# Altium schematic symbol library jlcpcb_2025_04_capacitors_extended_0402.schlib: 3594 symbols (part 14 of 20) (continued)
## GJM1555C1H1R0WB01D
designator C?  Capacitance: 1pF  (hidden comment: *)
Capacitor, Ceramic (MLCC), 1pF, 50V, C0G, SMD 0402; Manufacturer: Murata Electronics; Manufacturer Part Number: GJM1555C1H1R0WB01D; Package Size: 0402; JLCPCB Basic Part: No; JLCPCB Part Number: C72134; Supplier 1: LCSC; Category: Capacitors - MLCC; Supplier Part Number 1: C72134; Voltage Rating: 50V; Temperature Coefficient: C0G; RoHS: Yes; ComponentLink1Description: Datasheet; ComponentLink1URL: https://wmsc.lcsc.com/wmsc/upload/file/pdf/v2/lcsc/1811081612_Murata-Electronics-GJM1555C1H1R0WB01D_C72134.pdf; ComponentLink2Description: JLCPCB Part URL; ComponentLink2URL: https://jlcpcb.com/partdetail/C72134; ComponentLink3Description: LCSC Part URL; ComponentLink3URL: https://lcsc.com/product-detail/Multilayer-Ceramic-Capacitors-MLCC---SMD-SMT_Murata-Electronics-Murata-Electronics-GJM1555C1H1R0WB01D_C72134.html
footprint CAP-0402 (0402 (1005M) Capacitor)
pins: 1, 2

## GJM1555C1H1R1BB01D
designator C?  Capacitance: 1.1pF  (hidden comment: *)
Capacitor, Ceramic (MLCC), 1.1pF, 50V, C0G, SMD 0402; Manufacturer: Murata Electronics; Manufacturer Part Number: GJM1555C1H1R1BB01D; Package Size: 0402; JLCPCB Basic Part: No; JLCPCB Part Number: C161308; Supplier 1: LCSC; Category: Capacitors - MLCC; Supplier Part Number 1: C161308; Voltage Rating: 50V; Temperature Coefficient: C0G; RoHS: Yes; ComponentLink1Description: Datasheet; ComponentLink1URL: https://wmsc.lcsc.com/wmsc/upload/file/pdf/v2/lcsc/2304140030_Murata-Electronics-GJM1555C1H1R1BB01D_C161308.pdf; ComponentLink2Description: JLCPCB Part URL; ComponentLink2URL: https://jlcpcb.com/partdetail/C161308; ComponentLink3Description: LCSC Part URL; ComponentLink3URL: https://lcsc.com/product-detail/Multilayer-Ceramic-Capacitors-MLCC---SMD-SMT_Murata-Electronics-Murata-Electronics-GJM1555C1H1R1BB01D_C161308.html
footprint CAP-0402 (0402 (1005M) Capacitor)
pins: 1, 2

## GJM1555C1H1R1CB01D
designator C?  Capacitance: 1.1pF  (hidden comment: *)
Capacitor, Ceramic (MLCC), 1.1pF, 50V, C0G, SMD 0402; Manufacturer: Murata Electronics; Manufacturer Part Number: GJM1555C1H1R1CB01D; Package Size: 0402; JLCPCB Basic Part: No; JLCPCB Part Number: C237498; Supplier 1: LCSC; Category: Capacitors - MLCC; Supplier Part Number 1: C237498; Voltage Rating: 50V; Temperature Coefficient: C0G; RoHS: Yes; ComponentLink1Description: Datasheet; ComponentLink1URL: https://wmsc.lcsc.com/wmsc/upload/file/pdf/v2/lcsc/2304140030_Murata-Electronics-GJM1555C1H1R1CB01D_C237498.pdf; ComponentLink2Description: JLCPCB Part URL; ComponentLink2URL: https://jlcpcb.com/partdetail/C237498; ComponentLink3Description: LCSC Part URL; ComponentLink3URL: https://lcsc.com/product-detail/Multilayer-Ceramic-Capacitors-MLCC---SMD-SMT_Murata-Electronics-Murata-Electronics-GJM1555C1H1R1CB01D_C237498.html
footprint CAP-0402 (0402 (1005M) Capacitor)
pins: 1, 2

## GJM1555C1H1R1WB01D
designator C?  Capacitance: 1.1pF  (hidden comment: *)
Capacitor, Ceramic (MLCC), 1.1pF, 50V, C0G, SMD 0402; Manufacturer: Murata Electronics; Manufacturer Part Number: GJM1555C1H1R1WB01D; Package Size: 0402; JLCPCB Basic Part: No; JLCPCB Part Number: C88879; Supplier 1: LCSC; Category: Capacitors - MLCC; Supplier Part Number 1: C88879; Voltage Rating: 50V; Temperature Coefficient: C0G; RoHS: Yes; ComponentLink1Description: Datasheet; ComponentLink1URL: https://wmsc.lcsc.com/wmsc/upload/file/pdf/v2/lcsc/2304140030_Murata-Electronics-GJM1555C1H1R1WB01D_C88879.pdf; ComponentLink2Description: JLCPCB Part URL; ComponentLink2URL: https://jlcpcb.com/partdetail/C88879; ComponentLink3Description: LCSC Part URL; ComponentLink3URL: https://lcsc.com/product-detail/Multilayer-Ceramic-Capacitors-MLCC---SMD-SMT_Murata-Electronics-Murata-Electronics-GJM1555C1H1R1WB01D_C88879.html
footprint CAP-0402 (0402 (1005M) Capacitor)
pins: 1, 2

## GJM1555C1H1R2BB01D
designator C?  Capacitance: 1.2pF  (hidden comment: *)
Capacitor, Ceramic (MLCC), 1.2pF, 50V, SMD 0402; Manufacturer: Murata Electronics; Manufacturer Part Number: GJM1555C1H1R2BB01D; Package Size: 0402; JLCPCB Basic Part: No; JLCPCB Part Number: C72135; Supplier 1: LCSC; Category: Capacitors - MLCC; Supplier Part Number 1: C72135; Voltage Rating: 50V; RoHS: Yes; ComponentLink1Description: Datasheet; ComponentLink1URL: https://wmsc.lcsc.com/wmsc/upload/file/pdf/v2/lcsc/1811081614_Murata-Electronics-GJM1555C1H1R2BB01D_C72135.pdf; ComponentLink2Description: JLCPCB Part URL; ComponentLink2URL: https://jlcpcb.com/partdetail/C72135; ComponentLink3Description: LCSC Part URL; ComponentLink3URL: https://lcsc.com/product-detail/Multilayer-Ceramic-Capacitors-MLCC---SMD-SMT_Murata-Electronics-Murata-Electronics-GJM1555C1H1R2BB01D_C72135.html
footprint CAP-0402 (0402 (1005M) Capacitor)
pins: 1, 2

## GJM1555C1H1R2CB01D
designator C?  Capacitance: 1.2pF  (hidden comment: *)
Capacitor, Ceramic (MLCC), 1.2pF, 50V, C0G, SMD 0402; Manufacturer: Murata Electronics; Manufacturer Part Number: GJM1555C1H1R2CB01D; Package Size: 0402; JLCPCB Basic Part: No; JLCPCB Part Number: C85877; Supplier 1: LCSC; Category: Capacitors - MLCC; Supplier Part Number 1: C85877; Voltage Rating: 50V; Temperature Coefficient: C0G; RoHS: Yes; ComponentLink1Description: Datasheet; ComponentLink1URL: https://wmsc.lcsc.com/wmsc/upload/file/pdf/v2/lcsc/2304140030_Murata-Electronics-GJM1555C1H1R2CB01D_C85877.pdf; ComponentLink2Description: JLCPCB Part URL; ComponentLink2URL: https://jlcpcb.com/partdetail/C85877; ComponentLink3Description: LCSC Part URL; ComponentLink3URL: https://lcsc.com/product-detail/Multilayer-Ceramic-Capacitors-MLCC---SMD-SMT_Murata-Electronics-Murata-Electronics-GJM1555C1H1R2CB01D_C85877.html
footprint CAP-0402 (0402 (1005M) Capacitor)
pins: 1, 2

## GJM1555C1H1R2JB01D
designator C?  Capacitance: 1.2pF  (hidden comment: *)
Capacitor, Ceramic (MLCC), 1.2pF, ±5%, null, null, ±5%, SMD 0402; Manufacturer: Murata Electronics; Manufacturer Part Number: GJM1555C1H1R2JB01D; Package Size: 0402; JLCPCB Basic Part: No; JLCPCB Part Number: C907946; Supplier 1: LCSC; Category: Capacitors - MLCC; Supplier Part Number 1: C907946; Tolerance: ±5%; Voltage Rating: null; Temperature Coefficient: null; RoHS: Yes; ComponentLink1Description: Datasheet; ComponentLink1URL: https://wmsc.lcsc.com/wmsc/upload/file/pdf/v2/lcsc/2201242100_Murata-Electronics-GJM1555C1H1R2JB01D_C907946.pdf; ComponentLink2Description: JLCPCB Part URL; ComponentLink2URL: https://jlcpcb.com/partdetail/C907946; ComponentLink3Description: LCSC Part URL; ComponentLink3URL: https://lcsc.com/product-detail/Multilayer-Ceramic-Capacitors-MLCC---SMD-SMT_Murata-Electronics-Murata-Electronics-GJM1555C1H1R2JB01D_C907946.html
footprint CAP-0402 (0402 (1005M) Capacitor)
pins: 1, 2

## GJM1555C1H1R2WB01D
designator C?  Capacitance: 1.2pF  (hidden comment: *)
Capacitor, Ceramic (MLCC), 1.2pF, 50V, C0G, SMD 0402; Manufacturer: Murata Electronics; Manufacturer Part Number: GJM1555C1H1R2WB01D; Package Size: 0402; JLCPCB Basic Part: No; JLCPCB Part Number: C76899; Supplier 1: LCSC; Category: Capacitors - MLCC; Supplier Part Number 1: C76899; Voltage Rating: 50V; Temperature Coefficient: C0G; RoHS: Yes; ComponentLink1Description: Datasheet; ComponentLink1URL: https://wmsc.lcsc.com/wmsc/upload/file/pdf/v2/lcsc/1811081710_Murata-Electronics-GJM1555C1H1R2WB01D_C76899.pdf; ComponentLink2Description: JLCPCB Part URL; ComponentLink2URL: https://jlcpcb.com/partdetail/C76899; ComponentLink3Description: LCSC Part URL; ComponentLink3URL: https://lcsc.com/product-detail/Multilayer-Ceramic-Capacitors-MLCC---SMD-SMT_Murata-Electronics-Murata-Electronics-GJM1555C1H1R2WB01D_C76899.html
footprint CAP-0402 (0402 (1005M) Capacitor)
pins: 1, 2

## GJM1555C1H1R3BB01D
designator C?  Capacitance: 1.3pF  (hidden comment: *)
Capacitor, Ceramic (MLCC), 1.3pF, 50V, C0G, SMD 0402; Manufacturer: Murata Electronics; Manufacturer Part Number: GJM1555C1H1R3BB01D; Package Size: 0402; JLCPCB Basic Part: No; JLCPCB Part Number: C161309; Supplier 1: LCSC; Category: Capacitors - MLCC; Supplier Part Number 1: C161309; Voltage Rating: 50V; Temperature Coefficient: C0G; RoHS: Yes; ComponentLink1Description: Datasheet; ComponentLink1URL: https://wmsc.lcsc.com/wmsc/upload/file/pdf/v2/lcsc/1811081521_Murata-Electronics-GJM1555C1H1R3BB01D_C161309.pdf; ComponentLink2Description: JLCPCB Part URL; ComponentLink2URL: https://jlcpcb.com/partdetail/C161309; ComponentLink3Description: LCSC Part URL; ComponentLink3URL: https://lcsc.com/product-detail/Multilayer-Ceramic-Capacitors-MLCC---SMD-SMT_Murata-Electronics-Murata-Electronics-GJM1555C1H1R3BB01D_C161309.html
footprint CAP-0402 (0402 (1005M) Capacitor)
pins: 1, 2

## GJM1555C1H1R3WB01D
designator C?  Capacitance: 1.3pF  (hidden comment: *)
Capacitor, Ceramic (MLCC), 1.3pF, 50V, C0G, SMD 0402; Manufacturer: Murata Electronics; Manufacturer Part Number: GJM1555C1H1R3WB01D; Package Size: 0402; JLCPCB Basic Part: No; JLCPCB Part Number: C88880; Supplier 1: LCSC; Category: Capacitors - MLCC; Supplier Part Number 1: C88880; Voltage Rating: 50V; Temperature Coefficient: C0G; RoHS: Yes; ComponentLink1Description: Datasheet; ComponentLink1URL: https://wmsc.lcsc.com/wmsc/upload/file/pdf/v2/lcsc/2304140030_Murata-Electronics-GJM1555C1H1R3WB01D_C88880.pdf; ComponentLink2Description: JLCPCB Part URL; ComponentLink2URL: https://jlcpcb.com/partdetail/C88880; ComponentLink3Description: LCSC Part URL; ComponentLink3URL: https://lcsc.com/product-detail/Multilayer-Ceramic-Capacitors-MLCC---SMD-SMT_Murata-Electronics-Murata-Electronics-GJM1555C1H1R3WB01D_C88880.html
footprint CAP-0402 (0402 (1005M) Capacitor)
pins: 1, 2

## GJM1555C1H1R4BB01D
designator C?  Capacitance: 1.4pF  (hidden comment: *)
Capacitor, Ceramic (MLCC), 1.4pF, 50V, C0G, SMD 0402; Manufacturer: Murata Electronics; Manufacturer Part Number: GJM1555C1H1R4BB01D; Package Size: 0402; JLCPCB Basic Part: No; JLCPCB Part Number: C161310; Supplier 1: LCSC; Category: Capacitors - MLCC; Supplier Part Number 1: C161310; Voltage Rating: 50V; Temperature Coefficient: C0G; RoHS: Yes; ComponentLink1Description: Datasheet; ComponentLink1URL: https://wmsc.lcsc.com/wmsc/upload/file/pdf/v2/lcsc/2304140030_Murata-Electronics-GJM1555C1H1R4BB01D_C161310.pdf; ComponentLink2Description: JLCPCB Part URL; ComponentLink2URL: https://jlcpcb.com/partdetail/C161310; ComponentLink3Description: LCSC Part URL; ComponentLink3URL: https://lcsc.com/product-detail/Multilayer-Ceramic-Capacitors-MLCC---SMD-SMT_Murata-Electronics-Murata-Electronics-GJM1555C1H1R4BB01D_C161310.html
footprint CAP-0402 (0402 (1005M) Capacitor)
pins: 1, 2

## GJM1555C1H1R5BB01D
designator C?  Capacitance: 1.5pF  (hidden comment: *)
Capacitor, Ceramic (MLCC), 1.5pF, 50V, C0G, SMD 0402; Manufacturer: Murata Electronics; Manufacturer Part Number: GJM1555C1H1R5BB01D; Package Size: 0402; JLCPCB Basic Part: No; JLCPCB Part Number: C76900; Supplier 1: LCSC; Category: Capacitors - MLCC; Supplier Part Number 1: C76900; Voltage Rating: 50V; Temperature Coefficient: C0G; RoHS: Yes; ComponentLink1Description: Datasheet; ComponentLink1URL: https://wmsc.lcsc.com/wmsc/upload/file/pdf/v2/lcsc/1811081610_Murata-Electronics-GJM1555C1H1R5BB01D_C76900.pdf; ComponentLink2Description: JLCPCB Part URL; ComponentLink2URL: https://jlcpcb.com/partdetail/C76900; ComponentLink3Description: LCSC Part URL; ComponentLink3URL: https://lcsc.com/product-detail/Multilayer-Ceramic-Capacitors-MLCC---SMD-SMT_Murata-Electronics-Murata-Electronics-GJM1555C1H1R5BB01D_C76900.html
footprint CAP-0402 (0402 (1005M) Capacitor)
pins: 1, 2

## GJM1555C1H1R5CB01D
designator C?  Capacitance: 1.5pF  (hidden comment: *)
Capacitor, Ceramic (MLCC), 1.5pF, 50V, C0G, SMD 0402; Manufacturer: Murata Electronics; Manufacturer Part Number: GJM1555C1H1R5CB01D; Package Size: 0402; JLCPCB Basic Part: No; JLCPCB Part Number: C408127; Supplier 1: LCSC; Category: Capacitors - MLCC; Supplier Part Number 1: C408127; Voltage Rating: 50V; Temperature Coefficient: C0G; RoHS: Yes; ComponentLink1Description: Datasheet; ComponentLink1URL: https://wmsc.lcsc.com/wmsc/upload/file/pdf/v2/lcsc/2304140030_Murata-Electronics-GJM1555C1H1R5CB01D_C408127.pdf; ComponentLink2Description: JLCPCB Part URL; ComponentLink2URL: https://jlcpcb.com/partdetail/C408127; ComponentLink3Description: LCSC Part URL; ComponentLink3URL: https://lcsc.com/product-detail/Multilayer-Ceramic-Capacitors-MLCC---SMD-SMT_Murata-Electronics-Murata-Electronics-GJM1555C1H1R5CB01D_C408127.html
footprint CAP-0402 (0402 (1005M) Capacitor)
pins: 1, 2

## GJM1555C1H1R5WB01D
designator C?  Capacitance: 1.5pF  (hidden comment: *)
Capacitor, Ceramic (MLCC), 1.5pF, 50V, SMD 0402; Manufacturer: Murata Electronics; Manufacturer Part Number: GJM1555C1H1R5WB01D; Package Size: 0402; JLCPCB Basic Part: No; JLCPCB Part Number: C76901; Supplier 1: LCSC; Category: Capacitors - MLCC; Supplier Part Number 1: C76901; Voltage Rating: 50V; RoHS: Yes; ComponentLink1Description: Datasheet; ComponentLink1URL: https://wmsc.lcsc.com/wmsc/upload/file/pdf/v2/lcsc/1811131825_Murata-Electronics-GJM1555C1H1R5WB01D_C76901.pdf; ComponentLink2Description: JLCPCB Part URL; ComponentLink2URL: https://jlcpcb.com/partdetail/C76901; ComponentLink3Description: LCSC Part URL; ComponentLink3URL: https://lcsc.com/product-detail/Multilayer-Ceramic-Capacitors-MLCC---SMD-SMT_Murata-Electronics-Murata-Electronics-GJM1555C1H1R5WB01D_C76901.html
footprint CAP-0402 (0402 (1005M) Capacitor)
pins: 1, 2

## GJM1555C1H1R6BB01D
designator C?  Capacitance: 1.6pF  (hidden comment: *)
Capacitor, Ceramic (MLCC), 1.6pF, 50V, C0G, SMD 0402; Manufacturer: Murata Electronics; Manufacturer Part Number: GJM1555C1H1R6BB01D; Package Size: 0402; JLCPCB Basic Part: No; JLCPCB Part Number: C161311; Supplier 1: LCSC; Category: Capacitors - MLCC; Supplier Part Number 1: C161311; Voltage Rating: 50V; Temperature Coefficient: C0G; RoHS: Yes; ComponentLink1Description: Datasheet; ComponentLink1URL: https://wmsc.lcsc.com/wmsc/upload/file/pdf/v2/lcsc/1811081521_Murata-Electronics-GJM1555C1H1R6BB01D_C161311.pdf; ComponentLink2Description: JLCPCB Part URL; ComponentLink2URL: https://jlcpcb.com/partdetail/C161311; ComponentLink3Description: LCSC Part URL; ComponentLink3URL: https://lcsc.com/product-detail/Multilayer-Ceramic-Capacitors-MLCC---SMD-SMT_Murata-Electronics-Murata-Electronics-GJM1555C1H1R6BB01D_C161311.html
footprint CAP-0402 (0402 (1005M) Capacitor)
pins: 1, 2

## GJM1555C1H1R6CB01D
designator C?  Capacitance: 1.6pF  (hidden comment: *)
Capacitor, Ceramic (MLCC), 1.6pF, 50V, C0G, SMD 0402; Manufacturer: Murata Electronics; Manufacturer Part Number: GJM1555C1H1R6CB01D; Package Size: 0402; JLCPCB Basic Part: No; JLCPCB Part Number: C161312; Supplier 1: LCSC; Category: Capacitors - MLCC; Supplier Part Number 1: C161312; Voltage Rating: 50V; Temperature Coefficient: C0G; RoHS: Yes; ComponentLink1Description: Datasheet; ComponentLink1URL: https://wmsc.lcsc.com/wmsc/upload/file/pdf/v2/lcsc/2304140030_Murata-Electronics-GJM1555C1H1R6CB01D_C161312.pdf; ComponentLink2Description: JLCPCB Part URL; ComponentLink2URL: https://jlcpcb.com/partdetail/C161312; ComponentLink3Description: LCSC Part URL; ComponentLink3URL: https://lcsc.com/product-detail/Multilayer-Ceramic-Capacitors-MLCC---SMD-SMT_Murata-Electronics-Murata-Electronics-GJM1555C1H1R6CB01D_C161312.html
footprint CAP-0402 (0402 (1005M) Capacitor)
pins: 1, 2

## GJM1555C1H1R6WB01D
designator C?  Capacitance: 1.6pF  (hidden comment: *)
Capacitor, Ceramic (MLCC), 1.6pF, 50V, C0G, SMD 0402; Manufacturer: Murata Electronics; Manufacturer Part Number: GJM1555C1H1R6WB01D; Package Size: 0402; JLCPCB Basic Part: No; JLCPCB Part Number: C88881; Supplier 1: LCSC; Category: Capacitors - MLCC; Supplier Part Number 1: C88881; Voltage Rating: 50V; Temperature Coefficient: C0G; RoHS: Yes; ComponentLink1Description: Datasheet; ComponentLink1URL: https://wmsc.lcsc.com/wmsc/upload/file/pdf/v2/lcsc/2304140030_Murata-Electronics-GJM1555C1H1R6WB01D_C88881.pdf; ComponentLink2Description: JLCPCB Part URL; ComponentLink2URL: https://jlcpcb.com/partdetail/C88881; ComponentLink3Description: LCSC Part URL; ComponentLink3URL: https://lcsc.com/product-detail/Multilayer-Ceramic-Capacitors-MLCC---SMD-SMT_Murata-Electronics-Murata-Electronics-GJM1555C1H1R6WB01D_C88881.html
footprint CAP-0402 (0402 (1005M) Capacitor)
pins: 1, 2

## GJM1555C1H1R7BB01D
designator C?  Capacitance: 1.7pF  (hidden comment: *)
Capacitor, Ceramic (MLCC), 1.7pF, 50V, C0G, SMD 0402; Manufacturer: Murata Electronics; Manufacturer Part Number: GJM1555C1H1R7BB01D; Package Size: 0402; JLCPCB Basic Part: No; JLCPCB Part Number: C161313; Supplier 1: LCSC; Category: Capacitors - MLCC; Supplier Part Number 1: C161313; Voltage Rating: 50V; Temperature Coefficient: C0G; RoHS: Yes; ComponentLink1Description: Datasheet; ComponentLink1URL: https://wmsc.lcsc.com/wmsc/upload/file/pdf/v2/lcsc/2210251230_Murata-Electronics-GJM1555C1H1R7BB01D_C161313.pdf; ComponentLink2Description: JLCPCB Part URL; ComponentLink2URL: https://jlcpcb.com/partdetail/C161313; ComponentLink3Description: LCSC Part URL; ComponentLink3URL: https://lcsc.com/product-detail/Multilayer-Ceramic-Capacitors-MLCC---SMD-SMT_Murata-Electronics-Murata-Electronics-GJM1555C1H1R7BB01D_C161313.html
footprint CAP-0402 (0402 (1005M) Capacitor)
pins: 1, 2

## GJM1555C1H1R8BB01D
designator C?  Capacitance: 1.8pF  (hidden comment: *)
Capacitor, Ceramic (MLCC), 1.8pF, 50V, C0G, SMD 0402; Manufacturer: Murata Electronics; Manufacturer Part Number: GJM1555C1H1R8BB01D; Package Size: 0402; JLCPCB Basic Part: No; JLCPCB Part Number: C76902; Supplier 1: LCSC; Category: Capacitors - MLCC; Supplier Part Number 1: C76902; Voltage Rating: 50V; Temperature Coefficient: C0G; RoHS: Yes; ComponentLink1Description: Datasheet; ComponentLink1URL: https://wmsc.lcsc.com/wmsc/upload/file/pdf/v2/lcsc/1811081611_Murata-Electronics-GJM1555C1H1R8BB01D_C76902.pdf; ComponentLink2Description: JLCPCB Part URL; ComponentLink2URL: https://jlcpcb.com/partdetail/C76902; ComponentLink3Description: LCSC Part URL; ComponentLink3URL: https://lcsc.com/product-detail/Multilayer-Ceramic-Capacitors-MLCC---SMD-SMT_Murata-Electronics-Murata-Electronics-GJM1555C1H1R8BB01D_C76902.html
footprint CAP-0402 (0402 (1005M) Capacitor)
pins: 1, 2

## GJM1555C1H1R8CB01D
designator C?  Capacitance: 1.8pF  (hidden comment: *)
Capacitor, Ceramic (MLCC), 1.8pF, 50V, C0G, SMD 0402; Manufacturer: Murata Electronics; Manufacturer Part Number: GJM1555C1H1R8CB01D; Package Size: 0402; JLCPCB Basic Part: No; JLCPCB Part Number: C85878; Supplier 1: LCSC; Category: Capacitors - MLCC; Supplier Part Number 1: C85878; Voltage Rating: 50V; Temperature Coefficient: C0G; RoHS: Yes; ComponentLink1Description: Datasheet; ComponentLink1URL: https://wmsc.lcsc.com/wmsc/upload/file/pdf/v2/lcsc/2304140030_Murata-Electronics-GJM1555C1H1R8CB01D_C85878.pdf; ComponentLink2Description: JLCPCB Part URL; ComponentLink2URL: https://jlcpcb.com/partdetail/C85878; ComponentLink3Description: LCSC Part URL; ComponentLink3URL: https://lcsc.com/product-detail/Multilayer-Ceramic-Capacitors-MLCC---SMD-SMT_Murata-Electronics-Murata-Electronics-GJM1555C1H1R8CB01D_C85878.html
footprint CAP-0402 (0402 (1005M) Capacitor)
pins: 1, 2

## GJM1555C1H1R8WB01D
designator C?  Capacitance: 1.8pF  (hidden comment: *)
Capacitor, Ceramic (MLCC), 1.8pF, 50V, C0G, SMD 0402; Manufacturer: Murata Electronics; Manufacturer Part Number: GJM1555C1H1R8WB01D; Package Size: 0402; JLCPCB Basic Part: No; JLCPCB Part Number: C76903; Supplier 1: LCSC; Category: Capacitors - MLCC; Supplier Part Number 1: C76903; Voltage Rating: 50V; Temperature Coefficient: C0G; RoHS: Yes; ComponentLink1Description: Datasheet; ComponentLink1URL: https://wmsc.lcsc.com/wmsc/upload/file/pdf/v2/lcsc/1811081611_Murata-Electronics-GJM1555C1H1R8WB01D_C76903.pdf; ComponentLink2Description: JLCPCB Part URL; ComponentLink2URL: https://jlcpcb.com/partdetail/C76903; ComponentLink3Description: LCSC Part URL; ComponentLink3URL: https://lcsc.com/product-detail/Multilayer-Ceramic-Capacitors-MLCC---SMD-SMT_Murata-Electronics-Murata-Electronics-GJM1555C1H1R8WB01D_C76903.html
footprint CAP-0402 (0402 (1005M) Capacitor)
pins: 1, 2

## GJM1555C1H1R9BB01D
designator C?  Capacitance: 1.9pF  (hidden comment: *)
Capacitor, Ceramic (MLCC), 1.9pF, 50V, C0G, SMD 0402; Manufacturer: Murata Electronics; Manufacturer Part Number: GJM1555C1H1R9BB01D; Package Size: 0402; JLCPCB Basic Part: No; JLCPCB Part Number: C161314; Supplier 1: LCSC; Category: Capacitors - MLCC; Supplier Part Number 1: C161314; Voltage Rating: 50V; Temperature Coefficient: C0G; RoHS: Yes; ComponentLink1Description: Datasheet; ComponentLink1URL: https://wmsc.lcsc.com/wmsc/upload/file/pdf/v2/lcsc/2304140030_Murata-Electronics-GJM1555C1H1R9BB01D_C161314.pdf; ComponentLink2Description: JLCPCB Part URL; ComponentLink2URL: https://jlcpcb.com/partdetail/C161314; ComponentLink3Description: LCSC Part URL; ComponentLink3URL: https://lcsc.com/product-detail/Multilayer-Ceramic-Capacitors-MLCC---SMD-SMT_Murata-Electronics-Murata-Electronics-GJM1555C1H1R9BB01D_C161314.html
footprint CAP-0402 (0402 (1005M) Capacitor)
pins: 1, 2

## GJM1555C1H1R9WB01D
designator C?  Capacitance: 1.9pF  (hidden comment: *)
Capacitor, Ceramic (MLCC), 1.9pF, null, null, SMD 0402; Manufacturer: Murata Electronics; Manufacturer Part Number: GJM1555C1H1R9WB01D; Package Size: 0402; JLCPCB Basic Part: No; JLCPCB Part Number: C524559; Supplier 1: LCSC; Category: Capacitors - MLCC; Supplier Part Number 1: C524559; Voltage Rating: null; Temperature Coefficient: null; RoHS: Yes; ComponentLink1Description: Datasheet; ComponentLink1URL: https://wmsc.lcsc.com/wmsc/upload/file/pdf/v2/lcsc/2012181237_Murata-Electronics-GJM1555C1H1R9WB01D_C524559.pdf; ComponentLink2Description: JLCPCB Part URL; ComponentLink2URL: https://jlcpcb.com/partdetail/C524559; ComponentLink3Description: LCSC Part URL; ComponentLink3URL: https://lcsc.com/product-detail/Multilayer-Ceramic-Capacitors-MLCC---SMD-SMT_Murata-Electronics-Murata-Electronics-GJM1555C1H1R9WB01D_C524559.html
footprint CAP-0402 (0402 (1005M) Capacitor)
pins: 1, 2

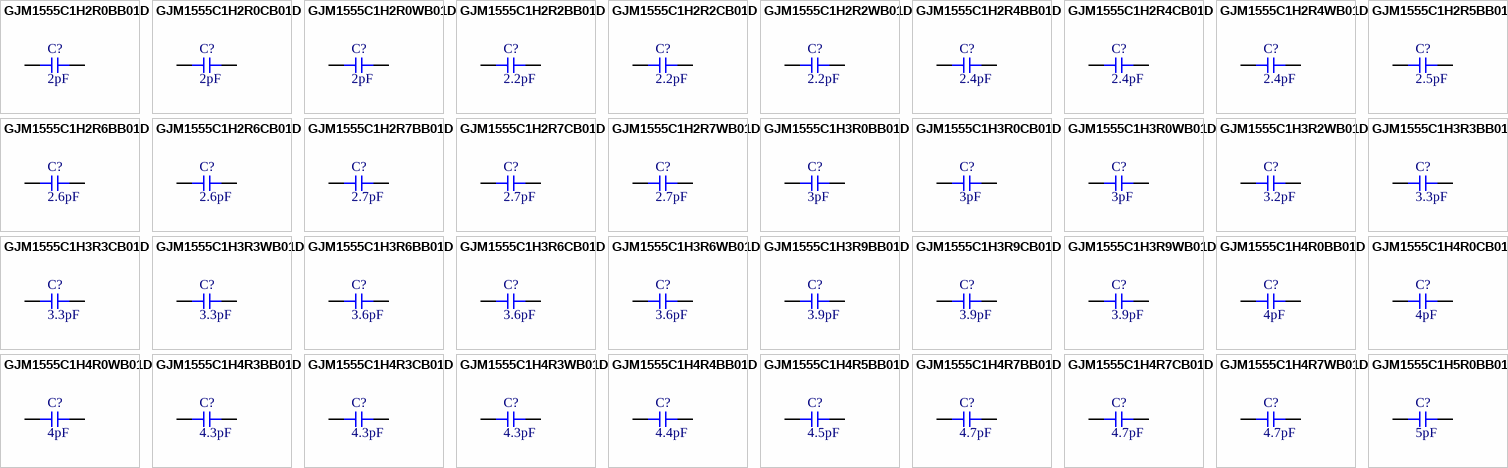
[diagram p62: symbols GJM1555C1H2R0BB01D to GJM1555C1H5R0BB01D]

## GJM1555C1H2R0BB01D
designator C?  Capacitance: 2pF  (hidden comment: *)
Capacitor, Ceramic (MLCC), 2pF, 50V, C0G, SMD 0402; Manufacturer: Murata Electronics; Manufacturer Part Number: GJM1555C1H2R0BB01D; Package Size: 0402; JLCPCB Basic Part: No; JLCPCB Part Number: C161316; Supplier 1: LCSC; Category: Capacitors - MLCC; Supplier Part Number 1: C161316; Voltage Rating: 50V; Temperature Coefficient: C0G; RoHS: Yes; ComponentLink1Description: Datasheet; ComponentLink1URL: https://wmsc.lcsc.com/wmsc/upload/file/pdf/v2/lcsc/1811081517_Murata-Electronics-GJM1555C1H2R0BB01D_C161316.pdf; ComponentLink2Description: JLCPCB Part URL; ComponentLink2URL: https://jlcpcb.com/partdetail/C161316; ComponentLink3Description: LCSC Part URL; ComponentLink3URL: https://lcsc.com/product-detail/Multilayer-Ceramic-Capacitors-MLCC---SMD-SMT_Murata-Electronics-Murata-Electronics-GJM1555C1H2R0BB01D_C161316.html
footprint CAP-0402 (0402 (1005M) Capacitor)
pins: 1, 2

## GJM1555C1H2R0CB01D
designator C?  Capacitance: 2pF  (hidden comment: *)
Capacitor, Ceramic (MLCC), 2pF, 50V, C0G, SMD 0402; Manufacturer: Murata Electronics; Manufacturer Part Number: GJM1555C1H2R0CB01D; Package Size: 0402; JLCPCB Basic Part: No; JLCPCB Part Number: C85879; Supplier 1: LCSC; Category: Capacitors - MLCC; Supplier Part Number 1: C85879; Voltage Rating: 50V; Temperature Coefficient: C0G; RoHS: Yes; ComponentLink1Description: Datasheet; ComponentLink1URL: https://wmsc.lcsc.com/wmsc/upload/file/pdf/v2/lcsc/2304140030_Murata-Electronics-GJM1555C1H2R0CB01D_C85879.pdf; ComponentLink2Description: JLCPCB Part URL; ComponentLink2URL: https://jlcpcb.com/partdetail/C85879; ComponentLink3Description: LCSC Part URL; ComponentLink3URL: https://lcsc.com/product-detail/Multilayer-Ceramic-Capacitors-MLCC---SMD-SMT_Murata-Electronics-Murata-Electronics-GJM1555C1H2R0CB01D_C85879.html
footprint CAP-0402 (0402 (1005M) Capacitor)
pins: 1, 2

## GJM1555C1H2R0WB01D
designator C?  Capacitance: 2pF  (hidden comment: *)
Capacitor, Ceramic (MLCC), 2pF, 50V, C0G, SMD 0402; Manufacturer: Murata Electronics; Manufacturer Part Number: GJM1555C1H2R0WB01D; Package Size: 0402; JLCPCB Basic Part: No; JLCPCB Part Number: C88885; Supplier 1: LCSC; Category: Capacitors - MLCC; Supplier Part Number 1: C88885; Voltage Rating: 50V; Temperature Coefficient: C0G; RoHS: Yes; ComponentLink1Description: Datasheet; ComponentLink1URL: https://wmsc.lcsc.com/wmsc/upload/file/pdf/v2/lcsc/2304140030_Murata-Electronics-GJM1555C1H2R0WB01D_C88885.pdf; ComponentLink2Description: JLCPCB Part URL; ComponentLink2URL: https://jlcpcb.com/partdetail/C88885; ComponentLink3Description: LCSC Part URL; ComponentLink3URL: https://lcsc.com/product-detail/Multilayer-Ceramic-Capacitors-MLCC---SMD-SMT_Murata-Electronics-Murata-Electronics-GJM1555C1H2R0WB01D_C88885.html
footprint CAP-0402 (0402 (1005M) Capacitor)
pins: 1, 2

## GJM1555C1H2R2BB01D
designator C?  Capacitance: 2.2pF  (hidden comment: *)
Capacitor, Ceramic (MLCC), 2.2pF, 50V, C0G, SMD 0402; Manufacturer: Murata Electronics; Manufacturer Part Number: GJM1555C1H2R2BB01D; Package Size: 0402; JLCPCB Basic Part: No; JLCPCB Part Number: C88886; Supplier 1: LCSC; Category: Capacitors - MLCC; Supplier Part Number 1: C88886; Voltage Rating: 50V; Temperature Coefficient: C0G; RoHS: Yes; ComponentLink1Description: Datasheet; ComponentLink1URL: https://wmsc.lcsc.com/wmsc/upload/file/pdf/v2/lcsc/2304140030_Murata-Electronics-GJM1555C1H2R2BB01D_C88886.pdf; ComponentLink2Description: JLCPCB Part URL; ComponentLink2URL: https://jlcpcb.com/partdetail/C88886; ComponentLink3Description: LCSC Part URL; ComponentLink3URL: https://lcsc.com/product-detail/Multilayer-Ceramic-Capacitors-MLCC---SMD-SMT_Murata-Electronics-Murata-Electronics-GJM1555C1H2R2BB01D_C88886.html
footprint CAP-0402 (0402 (1005M) Capacitor)
pins: 1, 2

## GJM1555C1H2R2CB01D
designator C?  Capacitance: 2.2pF  (hidden comment: *)
Capacitor, Ceramic (MLCC), 2.2pF, 50V, C0G, SMD 0402; Manufacturer: Murata Electronics; Manufacturer Part Number: GJM1555C1H2R2CB01D; Package Size: 0402; JLCPCB Basic Part: No; JLCPCB Part Number: C85880; Supplier 1: LCSC; Category: Capacitors - MLCC; Supplier Part Number 1: C85880; Voltage Rating: 50V; Temperature Coefficient: C0G; RoHS: Yes; ComponentLink1Description: Datasheet; ComponentLink1URL: https://wmsc.lcsc.com/wmsc/upload/file/pdf/v2/lcsc/2304140030_Murata-Electronics-GJM1555C1H2R2CB01D_C85880.pdf; ComponentLink2Description: JLCPCB Part URL; ComponentLink2URL: https://jlcpcb.com/partdetail/C85880; ComponentLink3Description: LCSC Part URL; ComponentLink3URL: https://lcsc.com/product-detail/Multilayer-Ceramic-Capacitors-MLCC---SMD-SMT_Murata-Electronics-Murata-Electronics-GJM1555C1H2R2CB01D_C85880.html
footprint CAP-0402 (0402 (1005M) Capacitor)
pins: 1, 2

## GJM1555C1H2R2WB01D
designator C?  Capacitance: 2.2pF  (hidden comment: *)
Capacitor, Ceramic (MLCC), 2.2pF, 50V, C0G, SMD 0402; Manufacturer: Murata Electronics; Manufacturer Part Number: GJM1555C1H2R2WB01D; Package Size: 0402; JLCPCB Basic Part: No; JLCPCB Part Number: C88887; Supplier 1: LCSC; Category: Capacitors - MLCC; Supplier Part Number 1: C88887; Voltage Rating: 50V; Temperature Coefficient: C0G; RoHS: Yes; ComponentLink1Description: Datasheet; ComponentLink1URL: https://wmsc.lcsc.com/wmsc/upload/file/pdf/v2/lcsc/2304140030_Murata-Electronics-GJM1555C1H2R2WB01D_C88887.pdf; ComponentLink2Description: JLCPCB Part URL; ComponentLink2URL: https://jlcpcb.com/partdetail/C88887; ComponentLink3Description: LCSC Part URL; ComponentLink3URL: https://lcsc.com/product-detail/Multilayer-Ceramic-Capacitors-MLCC---SMD-SMT_Murata-Electronics-Murata-Electronics-GJM1555C1H2R2WB01D_C88887.html
footprint CAP-0402 (0402 (1005M) Capacitor)
pins: 1, 2

## GJM1555C1H2R4BB01D
designator C?  Capacitance: 2.4pF  (hidden comment: *)
Capacitor, Ceramic (MLCC), 2.4pF, 50V, C0G, SMD 0402; Manufacturer: Murata Electronics; Manufacturer Part Number: GJM1555C1H2R4BB01D; Package Size: 0402; JLCPCB Basic Part: No; JLCPCB Part Number: C88888; Supplier 1: LCSC; Category: Capacitors - MLCC; Supplier Part Number 1: C88888; Voltage Rating: 50V; Temperature Coefficient: C0G; RoHS: Yes; ComponentLink1Description: Datasheet; ComponentLink1URL: https://wmsc.lcsc.com/wmsc/upload/file/pdf/v2/lcsc/2304140030_Murata-Electronics-GJM1555C1H2R4BB01D_C88888.pdf; ComponentLink2Description: JLCPCB Part URL; ComponentLink2URL: https://jlcpcb.com/partdetail/C88888; ComponentLink3Description: LCSC Part URL; ComponentLink3URL: https://lcsc.com/product-detail/Multilayer-Ceramic-Capacitors-MLCC---SMD-SMT_Murata-Electronics-Murata-Electronics-GJM1555C1H2R4BB01D_C88888.html
footprint CAP-0402 (0402 (1005M) Capacitor)
pins: 1, 2

## GJM1555C1H2R4CB01D
designator C?  Capacitance: 2.4pF  (hidden comment: *)
Capacitor, Ceramic (MLCC), 2.4pF, 50V, C0G, SMD 0402; Manufacturer: Murata Electronics; Manufacturer Part Number: GJM1555C1H2R4CB01D; Package Size: 0402; JLCPCB Basic Part: No; JLCPCB Part Number: C161317; Supplier 1: LCSC; Category: Capacitors - MLCC; Supplier Part Number 1: C161317; Voltage Rating: 50V; Temperature Coefficient: C0G; RoHS: Yes; ComponentLink1Description: Datasheet; ComponentLink1URL: https://wmsc.lcsc.com/wmsc/upload/file/pdf/v2/lcsc/2304140030_Murata-Electronics-GJM1555C1H2R4CB01D_C161317.pdf; ComponentLink2Description: JLCPCB Part URL; ComponentLink2URL: https://jlcpcb.com/partdetail/C161317; ComponentLink3Description: LCSC Part URL; ComponentLink3URL: https://lcsc.com/product-detail/Multilayer-Ceramic-Capacitors-MLCC---SMD-SMT_Murata-Electronics-Murata-Electronics-GJM1555C1H2R4CB01D_C161317.html
footprint CAP-0402 (0402 (1005M) Capacitor)
pins: 1, 2

## GJM1555C1H2R4WB01D
designator C?  Capacitance: 2.4pF  (hidden comment: *)
Capacitor, Ceramic (MLCC), 2.4pF, 50V, C0G, SMD 0402; Manufacturer: Murata Electronics; Manufacturer Part Number: GJM1555C1H2R4WB01D; Package Size: 0402; JLCPCB Basic Part: No; JLCPCB Part Number: C88889; Supplier 1: LCSC; Category: Capacitors - MLCC; Supplier Part Number 1: C88889; Voltage Rating: 50V; Temperature Coefficient: C0G; RoHS: Yes; ComponentLink1Description: Datasheet; ComponentLink1URL: https://wmsc.lcsc.com/wmsc/upload/file/pdf/v2/lcsc/2304140030_Murata-Electronics-GJM1555C1H2R4WB01D_C88889.pdf; ComponentLink2Description: JLCPCB Part URL; ComponentLink2URL: https://jlcpcb.com/partdetail/C88889; ComponentLink3Description: LCSC Part URL; ComponentLink3URL: https://lcsc.com/product-detail/Multilayer-Ceramic-Capacitors-MLCC---SMD-SMT_Murata-Electronics-Murata-Electronics-GJM1555C1H2R4WB01D_C88889.html
footprint CAP-0402 (0402 (1005M) Capacitor)
pins: 1, 2

## GJM1555C1H2R5BB01D
designator C?  Capacitance: 2.5pF  (hidden comment: *)
Capacitor, Ceramic (MLCC), 2.5pF, 50V, C0G, SMD 0402; Manufacturer: Murata Electronics; Manufacturer Part Number: GJM1555C1H2R5BB01D; Package Size: 0402; JLCPCB Basic Part: No; JLCPCB Part Number: C2217353; Supplier 1: LCSC; Category: Capacitors - MLCC; Supplier Part Number 1: C2217353; Voltage Rating: 50V; Temperature Coefficient: C0G; RoHS: Yes; ComponentLink1Description: Datasheet; ComponentLink1URL: https://wmsc.lcsc.com/wmsc/upload/file/pdf/v2/lcsc/2104170439_Murata-Electronics-GJM1555C1H2R5BB01D_C2217353.pdf; ComponentLink2Description: JLCPCB Part URL; ComponentLink2URL: https://jlcpcb.com/partdetail/C2217353; ComponentLink3Description: LCSC Part URL; ComponentLink3URL: https://lcsc.com/product-detail/Multilayer-Ceramic-Capacitors-MLCC---SMD-SMT_Murata-Electronics-Murata-Electronics-GJM1555C1H2R5BB01D_C2217353.html
footprint CAP-0402 (0402 (1005M) Capacitor)
pins: 1, 2

## GJM1555C1H2R6BB01D
designator C?  Capacitance: 2.6pF  (hidden comment: *)
Capacitor, Ceramic (MLCC), 2.6pF, 50V, C0G, SMD 0402; Manufacturer: Murata Electronics; Manufacturer Part Number: GJM1555C1H2R6BB01D; Package Size: 0402; JLCPCB Basic Part: No; JLCPCB Part Number: C3904484; Supplier 1: LCSC; Category: Capacitors - MLCC; Supplier Part Number 1: C3904484; Voltage Rating: 50V; Temperature Coefficient: C0G; RoHS: Yes; ComponentLink1Description: Datasheet; ComponentLink1URL: https://wmsc.lcsc.com/wmsc/upload/file/pdf/v2/lcsc/2308111807_Murata-Electronics-GJM1555C1H2R6BB01D_C3904484.pdf; ComponentLink2Description: JLCPCB Part URL; ComponentLink2URL: https://jlcpcb.com/partdetail/C3904484; ComponentLink3Description: LCSC Part URL; ComponentLink3URL: https://lcsc.com/product-detail/Multilayer-Ceramic-Capacitors-MLCC---SMD-SMT_Murata-Electronics-Murata-Electronics-GJM1555C1H2R6BB01D_C3904484.html
footprint CAP-0402 (0402 (1005M) Capacitor)
pins: 1, 2

## GJM1555C1H2R6CB01D
designator C?  Capacitance: 2.6pF  (hidden comment: *)
Capacitor, Ceramic (MLCC), 2.6pF, null, null, SMD 0402; Manufacturer: Murata Electronics; Manufacturer Part Number: GJM1555C1H2R6CB01D; Package Size: 0402; JLCPCB Basic Part: No; JLCPCB Part Number: C907950; Supplier 1: LCSC; Category: Capacitors - MLCC; Supplier Part Number 1: C907950; Voltage Rating: null; Temperature Coefficient: null; RoHS: Yes; ComponentLink1Description: Datasheet; ComponentLink1URL: https://wmsc.lcsc.com/wmsc/upload/file/pdf/v2/lcsc/2201242100_Murata-Electronics-GJM1555C1H2R6CB01D_C907950.pdf; ComponentLink2Description: JLCPCB Part URL; ComponentLink2URL: https://jlcpcb.com/partdetail/C907950; ComponentLink3Description: LCSC Part URL; ComponentLink3URL: https://lcsc.com/product-detail/Multilayer-Ceramic-Capacitors-MLCC---SMD-SMT_Murata-Electronics-Murata-Electronics-GJM1555C1H2R6CB01D_C907950.html
footprint CAP-0402 (0402 (1005M) Capacitor)
pins: 1, 2

## GJM1555C1H2R7BB01D
designator C?  Capacitance: 2.7pF  (hidden comment: *)
Capacitor, Ceramic (MLCC), 2.7pF, 50V, C0G, SMD 0402; Manufacturer: Murata Electronics; Manufacturer Part Number: GJM1555C1H2R7BB01D; Package Size: 0402; JLCPCB Basic Part: No; JLCPCB Part Number: C76904; Supplier 1: LCSC; Category: Capacitors - MLCC; Supplier Part Number 1: C76904; Voltage Rating: 50V; Temperature Coefficient: C0G; RoHS: Yes; ComponentLink1Description: Datasheet; ComponentLink1URL: https://wmsc.lcsc.com/wmsc/upload/file/pdf/v2/lcsc/1811081611_Murata-Electronics-GJM1555C1H2R7BB01D_C76904.pdf; ComponentLink2Description: JLCPCB Part URL; ComponentLink2URL: https://jlcpcb.com/partdetail/C76904; ComponentLink3Description: LCSC Part URL; ComponentLink3URL: https://lcsc.com/product-detail/Multilayer-Ceramic-Capacitors-MLCC---SMD-SMT_Murata-Electronics-Murata-Electronics-GJM1555C1H2R7BB01D_C76904.html
footprint CAP-0402 (0402 (1005M) Capacitor)
pins: 1, 2

## GJM1555C1H2R7CB01D
designator C?  Capacitance: 2.7pF  (hidden comment: *)
Capacitor, Ceramic (MLCC), 2.7pF, 50V, null, SMD 0402; Manufacturer: Murata Electronics; Manufacturer Part Number: GJM1555C1H2R7CB01D; Package Size: 0402; JLCPCB Basic Part: No; JLCPCB Part Number: C2169234; Supplier 1: LCSC; Category: Capacitors - MLCC; Supplier Part Number 1: C2169234; Voltage Rating: 50V; Temperature Coefficient: null; RoHS: Yes; ComponentLink1Description: Datasheet; ComponentLink1URL: https://wmsc.lcsc.com/wmsc/upload/file/pdf/v2/lcsc/2202040330_Murata-Electronics-GJM1555C1H2R7CB01D_C2169234.pdf; ComponentLink2Description: JLCPCB Part URL; ComponentLink2URL: https://jlcpcb.com/partdetail/C2169234; ComponentLink3Description: LCSC Part URL; ComponentLink3URL: https://lcsc.com/product-detail/Multilayer-Ceramic-Capacitors-MLCC---SMD-SMT_Murata-Electronics-Murata-Electronics-GJM1555C1H2R7CB01D_C2169234.html
footprint CAP-0402 (0402 (1005M) Capacitor)
pins: 1, 2

## GJM1555C1H2R7WB01D
designator C?  Capacitance: 2.7pF  (hidden comment: *)
Capacitor, Ceramic (MLCC), 2.7pF, 50V, C0G, SMD 0402; Manufacturer: Murata Electronics; Manufacturer Part Number: GJM1555C1H2R7WB01D; Package Size: 0402; JLCPCB Basic Part: No; JLCPCB Part Number: C88890; Supplier 1: LCSC; Category: Capacitors - MLCC; Supplier Part Number 1: C88890; Voltage Rating: 50V; Temperature Coefficient: C0G; RoHS: Yes; ComponentLink1Description: Datasheet; ComponentLink1URL: https://wmsc.lcsc.com/wmsc/upload/file/pdf/v2/lcsc/2304140030_Murata-Electronics-GJM1555C1H2R7WB01D_C88890.pdf; ComponentLink2Description: JLCPCB Part URL; ComponentLink2URL: https://jlcpcb.com/partdetail/C88890; ComponentLink3Description: LCSC Part URL; ComponentLink3URL: https://lcsc.com/product-detail/Multilayer-Ceramic-Capacitors-MLCC---SMD-SMT_Murata-Electronics-Murata-Electronics-GJM1555C1H2R7WB01D_C88890.html
footprint CAP-0402 (0402 (1005M) Capacitor)
pins: 1, 2

## GJM1555C1H3R0BB01D
designator C?  Capacitance: 3pF  (hidden comment: *)
Capacitor, Ceramic (MLCC), 3pF, 50V, C0G, SMD 0402; Manufacturer: Murata Electronics; Manufacturer Part Number: GJM1555C1H3R0BB01D; Package Size: 0402; JLCPCB Basic Part: No; JLCPCB Part Number: C88891; Supplier 1: LCSC; Category: Capacitors - MLCC; Supplier Part Number 1: C88891; Voltage Rating: 50V; Temperature Coefficient: C0G; RoHS: Yes; ComponentLink1Description: Datasheet; ComponentLink1URL: https://wmsc.lcsc.com/wmsc/upload/file/pdf/v2/lcsc/2304140030_Murata-Electronics-GJM1555C1H3R0BB01D_C88891.pdf; ComponentLink2Description: JLCPCB Part URL; ComponentLink2URL: https://jlcpcb.com/partdetail/C88891; ComponentLink3Description: LCSC Part URL; ComponentLink3URL: https://lcsc.com/product-detail/Multilayer-Ceramic-Capacitors-MLCC---SMD-SMT_Murata-Electronics-Murata-Electronics-GJM1555C1H3R0BB01D_C88891.html
footprint CAP-0402 (0402 (1005M) Capacitor)
pins: 1, 2

## GJM1555C1H3R0CB01D
designator C?  Capacitance: 3pF  (hidden comment: *)
Capacitor, Ceramic (MLCC), 3pF, null, null, SMD 0402; Manufacturer: Murata Electronics; Manufacturer Part Number: GJM1555C1H3R0CB01D; Package Size: 0402; JLCPCB Basic Part: No; JLCPCB Part Number: C882563; Supplier 1: LCSC; Category: Capacitors - MLCC; Supplier Part Number 1: C882563; Voltage Rating: null; Temperature Coefficient: null; RoHS: Yes; ComponentLink1Description: Datasheet; ComponentLink1URL: https://wmsc.lcsc.com/wmsc/upload/file/pdf/v2/lcsc/2304140030_Murata-Electronics-GJM1555C1H3R0CB01D_C882563.pdf; ComponentLink2Description: JLCPCB Part URL; ComponentLink2URL: https://jlcpcb.com/partdetail/C882563; ComponentLink3Description: LCSC Part URL; ComponentLink3URL: https://lcsc.com/product-detail/Multilayer-Ceramic-Capacitors-MLCC---SMD-SMT_Murata-Electronics-Murata-Electronics-GJM1555C1H3R0CB01D_C882563.html
footprint CAP-0402 (0402 (1005M) Capacitor)
pins: 1, 2

## GJM1555C1H3R0WB01D
designator C?  Capacitance: 3pF  (hidden comment: *)
Capacitor, Ceramic (MLCC), 3pF, 50V, C0G, SMD 0402; Manufacturer: Murata Electronics; Manufacturer Part Number: GJM1555C1H3R0WB01D; Package Size: 0402; JLCPCB Basic Part: No; JLCPCB Part Number: C161318; Supplier 1: LCSC; Category: Capacitors - MLCC; Supplier Part Number 1: C161318; Voltage Rating: 50V; Temperature Coefficient: C0G; RoHS: Yes; ComponentLink1Description: Datasheet; ComponentLink1URL: https://wmsc.lcsc.com/wmsc/upload/file/pdf/v2/lcsc/2304140030_Murata-Electronics-GJM1555C1H3R0WB01D_C161318.pdf; ComponentLink2Description: JLCPCB Part URL; ComponentLink2URL: https://jlcpcb.com/partdetail/C161318; ComponentLink3Description: LCSC Part URL; ComponentLink3URL: https://lcsc.com/product-detail/Multilayer-Ceramic-Capacitors-MLCC---SMD-SMT_Murata-Electronics-Murata-Electronics-GJM1555C1H3R0WB01D_C161318.html
footprint CAP-0402 (0402 (1005M) Capacitor)
pins: 1, 2

## GJM1555C1H3R2WB01D
designator C?  Capacitance: 3.2pF  (hidden comment: *)
Capacitor, Ceramic (MLCC), 3.2pF, 50V, C0G, SMD 0402; Manufacturer: Murata Electronics; Manufacturer Part Number: GJM1555C1H3R2WB01D; Package Size: 0402; JLCPCB Basic Part: No; JLCPCB Part Number: C161319; Supplier 1: LCSC; Category: Capacitors - MLCC; Supplier Part Number 1: C161319; Voltage Rating: 50V; Temperature Coefficient: C0G; RoHS: Yes; ComponentLink1Description: Datasheet; ComponentLink1URL: https://wmsc.lcsc.com/wmsc/upload/file/pdf/v2/lcsc/2304140030_Murata-Electronics-GJM1555C1H3R2WB01D_C161319.pdf; ComponentLink2Description: JLCPCB Part URL; ComponentLink2URL: https://jlcpcb.com/partdetail/C161319; ComponentLink3Description: LCSC Part URL; ComponentLink3URL: https://lcsc.com/product-detail/Multilayer-Ceramic-Capacitors-MLCC---SMD-SMT_Murata-Electronics-Murata-Electronics-GJM1555C1H3R2WB01D_C161319.html
footprint CAP-0402 (0402 (1005M) Capacitor)
pins: 1, 2

## GJM1555C1H3R3BB01D
designator C?  Capacitance: 3.3pF  (hidden comment: *)
Capacitor, Ceramic (MLCC), 3.3pF, 50V, C0G, SMD 0402; Manufacturer: Murata Electronics; Manufacturer Part Number: GJM1555C1H3R3BB01D; Package Size: 0402; JLCPCB Basic Part: No; JLCPCB Part Number: C76906; Supplier 1: LCSC; Category: Capacitors - MLCC; Supplier Part Number 1: C76906; Voltage Rating: 50V; Temperature Coefficient: C0G; RoHS: Yes; ComponentLink1Description: Datasheet; ComponentLink1URL: https://wmsc.lcsc.com/wmsc/upload/file/pdf/v2/lcsc/1811081611_Murata-Electronics-GJM1555C1H3R3BB01D_C76906.pdf; ComponentLink2Description: JLCPCB Part URL; ComponentLink2URL: https://jlcpcb.com/partdetail/C76906; ComponentLink3Description: LCSC Part URL; ComponentLink3URL: https://lcsc.com/product-detail/Multilayer-Ceramic-Capacitors-MLCC---SMD-SMT_Murata-Electronics-Murata-Electronics-GJM1555C1H3R3BB01D_C76906.html
footprint CAP-0402 (0402 (1005M) Capacitor)
pins: 1, 2

## GJM1555C1H3R3CB01D
designator C?  Capacitance: 3.3pF  (hidden comment: *)
Capacitor, Ceramic (MLCC), 3.3pF, 50V, C0G, SMD 0402; Manufacturer: Murata Electronics; Manufacturer Part Number: GJM1555C1H3R3CB01D; Package Size: 0402; JLCPCB Basic Part: No; JLCPCB Part Number: C85881; Supplier 1: LCSC; Category: Capacitors - MLCC; Supplier Part Number 1: C85881; Voltage Rating: 50V; Temperature Coefficient: C0G; RoHS: Yes; ComponentLink1Description: Datasheet; ComponentLink1URL: https://wmsc.lcsc.com/wmsc/upload/file/pdf/v2/lcsc/2304140030_Murata-Electronics-GJM1555C1H3R3CB01D_C85881.pdf; ComponentLink2Description: JLCPCB Part URL; ComponentLink2URL: https://jlcpcb.com/partdetail/C85881; ComponentLink3Description: LCSC Part URL; ComponentLink3URL: https://lcsc.com/product-detail/Multilayer-Ceramic-Capacitors-MLCC---SMD-SMT_Murata-Electronics-Murata-Electronics-GJM1555C1H3R3CB01D_C85881.html
footprint CAP-0402 (0402 (1005M) Capacitor)
pins: 1, 2

## GJM1555C1H3R3WB01D
designator C?  Capacitance: 3.3pF  (hidden comment: *)
Capacitor, Ceramic (MLCC), 3.3pF, 50V, C0G, SMD 0402; Manufacturer: Murata Electronics; Manufacturer Part Number: GJM1555C1H3R3WB01D; Package Size: 0402; JLCPCB Basic Part: No; JLCPCB Part Number: C88892; Supplier 1: LCSC; Category: Capacitors - MLCC; Supplier Part Number 1: C88892; Voltage Rating: 50V; Temperature Coefficient: C0G; RoHS: Yes; ComponentLink1Description: Datasheet; ComponentLink1URL: https://wmsc.lcsc.com/wmsc/upload/file/pdf/v2/lcsc/2304140030_Murata-Electronics-GJM1555C1H3R3WB01D_C88892.pdf; ComponentLink2Description: JLCPCB Part URL; ComponentLink2URL: https://jlcpcb.com/partdetail/C88892; ComponentLink3Description: LCSC Part URL; ComponentLink3URL: https://lcsc.com/product-detail/Multilayer-Ceramic-Capacitors-MLCC---SMD-SMT_Murata-Electronics-Murata-Electronics-GJM1555C1H3R3WB01D_C88892.html
footprint CAP-0402 (0402 (1005M) Capacitor)
pins: 1, 2

## GJM1555C1H3R6BB01D
designator C?  Capacitance: 3.6pF  (hidden comment: *)
Capacitor, Ceramic (MLCC), 3.6pF, 50V, C0G, SMD 0402; Manufacturer: Murata Electronics; Manufacturer Part Number: GJM1555C1H3R6BB01D; Package Size: 0402; JLCPCB Basic Part: No; JLCPCB Part Number: C161320; Supplier 1: LCSC; Category: Capacitors - MLCC; Supplier Part Number 1: C161320; Voltage Rating: 50V; Temperature Coefficient: C0G; RoHS: Yes; ComponentLink1Description: Datasheet; ComponentLink1URL: https://wmsc.lcsc.com/wmsc/upload/file/pdf/v2/lcsc/2304140030_Murata-Electronics-GJM1555C1H3R6BB01D_C161320.pdf; ComponentLink2Description: JLCPCB Part URL; ComponentLink2URL: https://jlcpcb.com/partdetail/C161320; ComponentLink3Description: LCSC Part URL; ComponentLink3URL: https://lcsc.com/product-detail/Multilayer-Ceramic-Capacitors-MLCC---SMD-SMT_Murata-Electronics-Murata-Electronics-GJM1555C1H3R6BB01D_C161320.html
footprint CAP-0402 (0402 (1005M) Capacitor)
pins: 1, 2
